# Altium footprint library ICS.PcbLib: 74 footprints (part 2 of 5)
Each footprint in its own frame and in the unit in brackets; x right, y up, seen from the top. Pads: shape width x height; smd on the part's side, far side on the other; paste and mask are expansions set on the pad; w line width, h text height; cw(c..) or ccw(c..) is an arc to the next point about the centre after c.
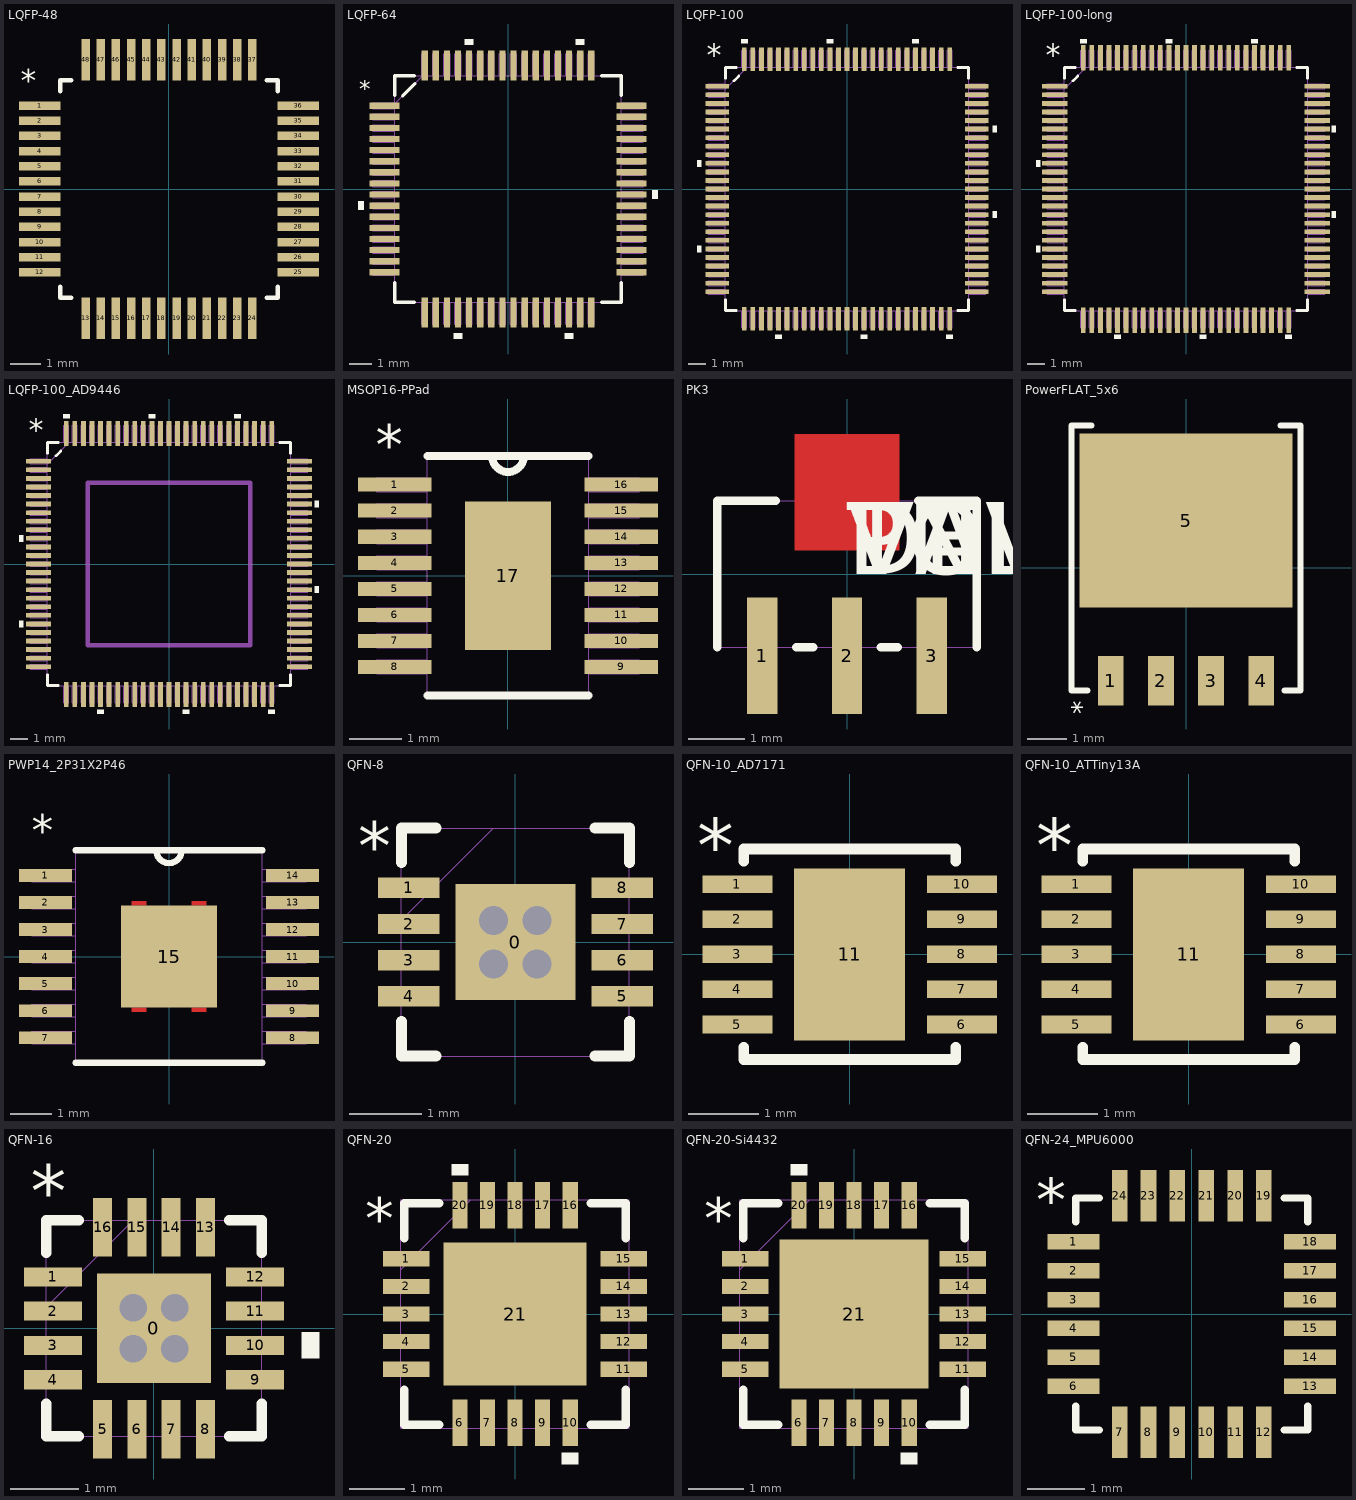
[diagram p1: the footprints below, top view; thin cyan lines are the x and y axes]

## LQFP-48 [mil]
pads (48):
  rect 54x11 smd: 1(-167.87,108.27) 2(-167.87,88.58) 3(-167.87,68.9) 4(-167.87,49.21) 5(-167.87,29.53) 6(-167.87,9.84) 7(-167.87,-9.84) 8(-167.87,-29.53) 9(-167.87,-49.21) 10(-167.87,-68.9) 11(-167.87,-88.58) 12(-167.87,-108.27) 25(167.87,-108.27) 26(167.87,-88.58) 27(167.87,-68.9) 28(167.87,-49.21) 29(167.87,-29.53) 30(167.87,-9.84) 31(167.87,9.84) 32(167.87,29.53) 33(167.87,49.21) 34(167.87,68.9) 35(167.87,88.58) 36(167.87,108.27)
  rect 11x54 smd: 13(-108.27,-167.87) 14(-88.58,-167.87) 15(-68.9,-167.87) 16(-49.21,-167.87) 17(-29.53,-167.87) 18(-9.84,-167.87) 19(9.84,-167.87) 20(29.53,-167.87) 21(49.21,-167.87) 22(68.9,-167.87) 23(88.58,-167.87) 24(108.27,-167.87) 37(108.27,167.87) 38(88.58,167.87) 39(68.9,167.87) 40(49.21,167.87) 41(29.53,167.87) 42(9.84,167.87) 43(-9.84,167.87) 44(-29.53,167.87) 45(-49.21,167.87) 46(-68.9,167.87) 47(-88.58,167.87) 48(-108.27,167.87)
Top Overlay:
  lines w6: -141.5,-126.87 -141.5,-141.5 -126.87,-141.5 ; -141.5,126.87 -141.5,141.5 -126.87,141.5 ; 126.87,-141.5 141.5,-141.5 141.5,-126.87 ; 126.87,141.5 141.5,141.5 141.5,126.87
  text "*" at -192.91,125.98 h30
3D body: height 59.15, standoff 0.48, extent -177.47,-177.47 177.46,177.46

## LQFP-64 [mil]
pads (64):
  rect 53.5x11 smd: 1(-219.25,147.64) 2(-219.25,127.95) 3(-219.25,108.27) 4(-219.25,88.58) 5(-219.25,68.9) 6(-219.25,49.21) 7(-219.25,29.53) 8(-219.25,9.84) 9(-219.25,-9.84) 10(-219.25,-29.53) 11(-219.25,-49.21) 12(-219.25,-68.9) 13(-219.25,-88.58) 14(-219.25,-108.27) 15(-219.25,-127.95) 16(-219.25,-147.64) 33(219.25,-147.64) 34(219.25,-127.95) 35(219.25,-108.27) 36(219.25,-88.58) 37(219.25,-68.9) 38(219.25,-49.21) 39(219.25,-29.53) 40(219.25,-9.84) 41(219.25,9.84) 42(219.25,29.53) 43(219.25,49.21) 44(219.25,68.9) 45(219.25,88.58) 46(219.25,108.27) 47(219.25,127.95) 48(219.25,147.64)
  rect 11x53.5 smd: 17(-147.64,-219.25) 18(-127.95,-219.25) 19(-108.27,-219.25) 20(-88.58,-219.25) 21(-68.9,-219.25) 22(-49.21,-219.25) 23(-29.53,-219.25) 24(-9.84,-219.25) 25(9.84,-219.25) 26(29.53,-219.25) 27(49.21,-219.25) 28(68.9,-219.25) 29(88.58,-219.25) 30(108.27,-219.25) 31(127.95,-219.25) 32(147.64,-219.25) 49(147.64,219.25) 50(127.95,219.25) 51(108.27,219.25) 52(88.58,219.25) 53(68.9,219.25) 54(49.21,219.25) 55(29.53,219.25) 56(9.84,219.25) 57(-9.84,219.25) 58(-29.53,219.25) 59(-49.21,219.25) 60(-68.9,219.25) 61(-88.58,219.25) 62(-108.27,219.25) 63(-127.95,219.25) 64(-147.64,219.25)
Top Overlay:
  region: -256,-22.03 -266,-22.03 -266,-37.03 -256,-37.03
  region: -81.08,-256 -96.08,-256 -96.08,-266 -81.08,-266
  region: 115.77,-256 100.77,-256 100.77,-266 115.77,-266
  region: 256,-2.34 266,-2.34 266,-17.34 256,-17.34
  region: 135.45,256 120.45,256 120.45,266 135.45,266
  region: -61.4,256 -76.4,256 -76.4,266 -61.4,266
  lines w6: -201,-166.24 -201,-201 -166.24,-201 ; -201,166.24 -201,201 -166.24,201 ; -186.98,165.02 -165.02,186.98 ; 166.24,-201 201,-201 201,-166.24 ; 166.24,201 201,201 201,166.24
  text "*" at -263.78,161.42 h30
Mechanical 1:
  drawing of 261 lines, arcs and shapes, not listed
3D body: height 58.77, standoff 0.6, extent -236.22,-236.22 236.22,236.22

## LQFP-100 [mil]
pads (100):
  rect 54x11 smd: 1(-298,236.22) 2(-298,216.54) 3(-298,196.85) 4(-298,177.17) 5(-298,157.48) 6(-298,137.8) 7(-298,118.11) 8(-298,98.43) 9(-298,78.74) 10(-298,59.06) 11(-298,39.37) 12(-298,19.69) 13(-298,0) 14(-298,-19.68) 15(-298,-39.37) 16(-298,-59.06) 17(-298,-78.74) 18(-298,-98.43) 19(-298,-118.11) 20(-298,-137.8) 21(-298,-157.48) 22(-298,-177.17) 23(-298,-196.85) 24(-298,-216.54) 25(-298,-236.22) 51(298,-236.22) 52(298,-216.54) 53(298,-196.85) 54(298,-177.17) 55(298,-157.48) 56(298,-137.8) 57(298,-118.11) 58(298,-98.43) 59(298,-78.74) 60(298,-59.06) 61(298,-39.37) 62(298,-19.68) 63(298,0) 64(298,19.68) 65(298,39.37) 66(298,59.06) 67(298,78.74) 68(298,98.43) 69(298,118.11) 70(298,137.8) 71(298,157.48) 72(298,177.17) 73(298,196.85) 74(298,216.54) 75(298,236.22)
  rect 11x54 smd: 26(-236.22,-298) 27(-216.54,-298) 28(-196.85,-298) 29(-177.17,-298) 30(-157.48,-298) 31(-137.8,-298) 32(-118.11,-298) 33(-98.43,-298) 34(-78.74,-298) 35(-59.06,-298) 36(-39.37,-298) 37(-19.68,-298) 38(0,-298) 39(19.68,-298) 40(39.37,-298) 41(59.06,-298) 42(78.74,-298) 43(98.43,-298) 44(118.11,-298) 45(137.8,-298) 46(157.48,-298) 47(177.17,-298) 48(196.85,-298) 49(216.54,-298) 50(236.22,-298) 76(236.22,298) 77(216.54,298) 78(196.85,298) 79(177.17,298) 80(157.48,298) 81(137.8,298) 82(118.11,298) 83(98.43,298) 84(78.74,298) 85(59.06,298) 86(39.37,298) 87(19.68,298) 88(0,298) 89(-19.68,298) 90(-39.37,298) 91(-59.06,298) 92(-78.74,298) 93(-98.43,298) 94(-118.11,298) 95(-137.8,298) 96(-157.48,298) 97(-177.17,298) 98(-196.85,298) 99(-216.54,298) 100(-236.22,298)
Top Overlay:
  region: -335,66.56 -345,66.56 -345,51.56 -335,51.56
  region: -335,-130.3 -345,-130.3 -345,-145.3 -335,-145.3
  region: -149.98,-335 -164.98,-335 -164.98,-345 -149.98,-345
  region: 46.87,-335 31.87,-335 31.87,-345 46.87,-345
  region: 243.72,-335 228.72,-335 228.72,-345 243.72,-345
  region: 335,-51.56 345,-51.56 345,-66.56 335,-66.56
  region: 335,145.3 345,145.3 345,130.3 335,130.3
  region: 164.98,335 149.98,335 149.98,345 164.98,345
  region: -31.87,335 -46.87,335 -46.87,345 -31.87,345
  region: -228.72,335 -243.72,335 -243.72,345 -228.72,345
  lines w6: -279.5,-254.82 -279.5,-279.5 -254.82,-279.5 ; -279.5,254.82 -279.5,279.5 -254.82,279.5 ; -260.07,248.93 -248.93,260.07 ; 254.82,-279.5 279.5,-279.5 279.5,-254.82 ; 254.82,279.5 279.5,279.5 279.5,254.82
  text "*" at -322.83,283.46 h50
Mechanical 1:
  drawing of 405 lines, arcs and shapes, not listed
3D body: height 59.21, standoff 0.48, extent -314.96,-314.96 314.96,314.95

## LQFP-100-long [mil]
pads (100):
  rect 57.95x11 smd: 1(-301.94,236.22) 2(-301.94,216.54) 3(-301.94,196.85) 4(-301.94,177.17) 5(-301.94,157.48) 6(-301.94,137.8) 7(-301.94,118.11) 8(-301.94,98.43) 9(-301.94,78.74) 10(-301.94,59.06) 11(-301.94,39.37) 12(-301.94,19.69) 13(-301.94,0) 14(-301.94,-19.68) 15(-301.94,-39.37) 16(-301.94,-59.06) 17(-301.94,-78.74) 18(-301.94,-98.43) 19(-301.94,-118.11) 20(-301.94,-137.8) 21(-301.94,-157.48) 22(-301.94,-177.17) 23(-301.94,-196.85) 24(-301.94,-216.54) 25(-301.94,-236.22) 51(301.94,-236.22) 52(301.94,-216.54) 53(301.94,-196.85) 54(301.94,-177.17) 55(301.94,-157.48) 56(301.94,-137.8) 57(301.94,-118.11) 58(301.94,-98.43) 59(301.94,-78.74) 60(301.94,-59.06) 61(301.94,-39.37) 62(301.94,-19.68) 63(301.94,0) 64(301.94,19.68) 65(301.94,39.37) 66(301.94,59.06) 67(301.94,78.74) 68(301.94,98.43) 69(301.94,118.11) 70(301.94,137.8) 71(301.94,157.48) 72(301.94,177.17) 73(301.94,196.85) 74(301.94,216.54) 75(301.94,236.22)
  rect 11x57.95 smd: 26(-236.22,-301.94) 27(-216.54,-301.94) 28(-196.85,-301.94) 29(-177.17,-301.94) 30(-157.48,-301.94) 31(-137.8,-301.94) 32(-118.11,-301.94) 33(-98.43,-301.94) 34(-78.74,-301.94) 35(-59.06,-301.94) 36(-39.37,-301.94) 37(-19.68,-301.94) 38(0,-301.94) 39(19.68,-301.94) 40(39.37,-301.94) 41(59.06,-301.94) 42(78.74,-301.94) 43(98.43,-301.94) 44(118.11,-301.94) 45(137.8,-301.94) 46(157.48,-301.94) 47(177.17,-301.94) 48(196.85,-301.94) 49(216.54,-301.94) 50(236.22,-301.94) 76(236.22,301.94) 77(216.54,301.94) 78(196.85,301.94) 79(177.17,301.94) 80(157.48,301.94) 81(137.8,301.94) 82(118.11,301.94) 83(98.43,301.94) 84(78.74,301.94) 85(59.06,301.94) 86(39.37,301.94) 87(19.68,301.94) 88(0,301.94) 89(-19.68,301.94) 90(-39.37,301.94) 91(-59.06,301.94) 92(-78.74,301.94) 93(-98.43,301.94) 94(-118.11,301.94) 95(-137.8,301.94) 96(-157.48,301.94) 97(-177.17,301.94) 98(-196.85,301.94) 99(-216.54,301.94) 100(-236.22,301.94)
Top Overlay:
  region: -228.72,335 -243.72,335 -243.72,345 -228.72,345
  region: -31.87,335 -46.87,335 -46.87,345 -31.87,345
  region: 164.98,335 149.98,335 149.98,345 164.98,345
  region: 335,145.3 345,145.3 345,130.3 335,130.3
  region: 335,-51.56 345,-51.56 345,-66.56 335,-66.56
  region: 243.72,-335 228.72,-335 228.72,-345 243.72,-345
  region: 46.87,-335 31.87,-335 31.87,-345 46.87,-345
  region: -149.98,-335 -164.98,-335 -164.98,-345 -149.98,-345
  region: -335,-130.3 -345,-130.3 -345,-145.3 -335,-145.3
  region: -335,66.56 -345,66.56 -345,51.56 -335,51.56
  lines w6: -279.5,-254.82 -279.5,-279.5 -254.82,-279.5 ; -279.5,254.82 -279.5,279.5 -254.82,279.5 ; -260.07,248.93 -248.93,260.07 ; 254.82,-279.5 279.5,-279.5 279.5,-254.82 ; 254.82,279.5 279.5,279.5 279.5,254.82
  text "*" at -322.83,283.46 h50
Mechanical 1:
  drawing of 405 lines, arcs and shapes, not listed
3D body: height 59.21, standoff 0.48, extent -314.96,-314.96 314.96,314.95

## LQFP-100_AD9446 [mil]
pads (100):
  rect 57.95x11 smd: 1(-299.97,236.22) 2(-299.97,216.54) 3(-299.97,196.85) 4(-299.97,177.17) 5(-299.97,157.48) 6(-299.97,137.8) 7(-299.97,118.11) 8(-299.97,98.43) 9(-299.97,78.74) 10(-299.97,59.06) 11(-299.97,39.37) 12(-299.97,19.69) 13(-299.97,0) 14(-299.97,-19.68) 15(-299.97,-39.37) 16(-299.97,-59.06) 17(-299.97,-78.74) 18(-299.97,-98.43) 19(-299.97,-118.11) 20(-299.97,-137.8) 21(-299.97,-157.48) 22(-299.97,-177.17) 23(-299.97,-196.85) 24(-299.97,-216.54) 25(-299.97,-236.22) 51(299.97,-236.22) 52(299.97,-216.54) 53(299.97,-196.85) 54(299.97,-177.17) 55(299.97,-157.48) 56(299.97,-137.8) 57(299.97,-118.11) 58(299.97,-98.43) 59(299.97,-78.74) 60(299.97,-59.06) 61(299.97,-39.37) 62(299.97,-19.68) 63(299.97,0) 64(299.97,19.68) 65(299.97,39.37) 66(299.97,59.06) 67(299.97,78.74) 68(299.97,98.43) 69(299.97,118.11) 70(299.97,137.8) 71(299.97,157.48) 72(299.97,177.17) 73(299.97,196.85) 74(299.97,216.54) 75(299.97,236.22)
  rect 11x57.95 smd: 26(-236.22,-299.97) 27(-216.54,-299.97) 28(-196.85,-299.97) 29(-177.17,-299.97) 30(-157.48,-299.97) 31(-137.8,-299.97) 32(-118.11,-299.97) 33(-98.43,-299.97) 34(-78.74,-299.97) 35(-59.06,-299.97) 36(-39.37,-299.97) 37(-19.68,-299.97) 38(0,-299.97) 39(19.68,-299.97) 40(39.37,-299.97) 41(59.06,-299.97) 42(78.74,-299.97) 43(98.43,-299.97) 44(118.11,-299.97) 45(137.8,-299.97) 46(157.48,-299.97) 47(177.17,-299.97) 48(196.85,-299.97) 49(216.54,-299.97) 50(236.22,-299.97) 76(236.22,299.97) 77(216.54,299.97) 78(196.85,299.97) 79(177.17,299.97) 80(157.48,299.97) 81(137.8,299.97) 82(118.11,299.97) 83(98.43,299.97) 84(78.74,299.97) 85(59.06,299.97) 86(39.37,299.97) 87(19.68,299.97) 88(0,299.97) 89(-19.68,299.97) 90(-39.37,299.97) 91(-59.06,299.97) 92(-78.74,299.97) 93(-98.43,299.97) 94(-118.11,299.97) 95(-137.8,299.97) 96(-157.48,299.97) 97(-177.17,299.97) 98(-196.85,299.97) 99(-216.54,299.97) 100(-236.22,299.97)
Top Overlay:
  region: 335,145.3 345,145.3 345,130.3 335,130.3
  region: 335,-51.56 345,-51.56 345,-66.56 335,-66.56
  region: -228.72,335 -243.72,335 -243.72,345 -228.72,345
  region: -31.87,335 -46.87,335 -46.87,345 -31.87,345
  region: 164.98,335 149.98,335 149.98,345 164.98,345
  region: -335,-130.3 -345,-130.3 -345,-145.3 -335,-145.3
  region: -335,66.56 -345,66.56 -345,51.56 -335,51.56
  region: 243.72,-335 228.72,-335 228.72,-345 243.72,-345
  region: 46.87,-335 31.87,-335 31.87,-345 46.87,-345
  region: -149.98,-335 -164.98,-335 -164.98,-345 -149.98,-345
  lines w6: -279.5,-254.82 -279.5,-279.5 -254.82,-279.5 ; -279.5,254.82 -279.5,279.5 -254.82,279.5 ; -260.07,248.93 -248.93,260.07 ; 254.82,-279.5 279.5,-279.5 279.5,-254.82 ; 254.82,279.5 279.5,279.5 279.5,254.82
  text "*" at -322.83,283.46 h50
Mechanical 1:
  drawing of 405 lines, arcs and shapes, not listed
Mechanical 13:
  lines w10: -187.01,-187.01 187.01,-187.01 187.01,187.01 -187.01,187.01 -187.01,-187.01
3D body: height 59.21, standoff 0.48, extent -314.96,-314.96 314.96,314.95

## MSOP16-PPad [mm]
pads (17):
  rect 1.411x0.27 smd: 1(-2.175,1.75) 2(-2.175,1.25) 3(-2.175,0.75) 4(-2.175,0.25) 5(-2.175,-0.25) 6(-2.175,-0.75) 7(-2.175,-1.25) 8(-2.175,-1.75) 9(2.175,-1.75) 10(2.175,-1.25) 11(2.175,-0.75) 12(2.175,-0.25) 13(2.175,0.25) 14(2.175,0.75) 15(2.175,1.25) 16(2.175,1.75)
  rect 1.65x2.85 smd: 17(0,0)
Top Overlay:
  lines w0.152: -1.55,-2.3 1.55,-2.3 ; -1.55,2.3 1.55,2.3 ; -0.305,2.3 ccw(c0,2.3) 0.305,2.3
  text "*" at -2.54,2.147 h0.76
Mechanical 1:
  lines w0: -0.305,2.3 ccw(c0,2.3) 0.305,2.3 ; -2.525,-1.885 -1.55,-1.885 -1.55,-1.615 -2.525,-1.615 -2.525,-1.885 ; -2.525,-1.385 -1.55,-1.385 -1.55,-1.115 -2.525,-1.115 -2.525,-1.385 ; -2.525,-0.885 -1.55,-0.885 -1.55,-0.615 -2.525,-0.615 -2.525,-0.885 ; -2.525,-0.385 -2.525,-0.115 -1.55,-0.115 -1.55,-0.385 -2.525,-0.385 ; -2.525,0.115 -2.525,0.385 -1.55,0.385 -1.55,0.115 -2.525,0.115 ; -2.525,0.615 -2.525,0.885 -1.55,0.885 -1.55,0.615 -2.525,0.615 ; -2.525,1.115 -2.525,1.385 -1.55,1.385 -1.55,1.115 -2.525,1.115 ; -2.525,1.615 -2.525,1.885 -1.55,1.885 -1.55,1.615 -2.525,1.615 ; -1.55,-2.3 1.55,-2.3 1.55,2.3 -1.55,2.3 -1.55,-2.3 ; 1.55,-1.885 2.525,-1.885 2.525,-1.615 1.55,-1.615 1.55,-1.885 ; 1.55,-1.385 2.525,-1.385 2.525,-1.115 1.55,-1.115 1.55,-1.385 ; 1.55,-0.885 2.525,-0.885 2.525,-0.615 1.55,-0.615 1.55,-0.885 ; 1.55,-0.385 1.55,-0.115 2.525,-0.115 2.525,-0.385 1.55,-0.385 ; 1.55,0.115 1.55,0.385 2.525,0.385 2.525,0.115 1.55,0.115 ; 1.55,0.615 1.55,0.885 2.525,0.885 2.525,0.615 1.55,0.615 ; 1.55,1.115 1.55,1.385 2.525,1.385 2.525,1.115 1.55,1.115 ; 1.55,1.615 1.55,1.885 2.525,1.885 2.525,1.615 1.55,1.615
3D body: height 0.97, standoff 0.02, extent -2.45,-2.019 2.45,2.019

## PK3 [mil]
pads (3):
  rect 21x81 smd: 1(-59.06,-57) 2(0,-57) 3(59.06,-57)
Top Layer:
  region: 36.5,16.5 36.5,97.5 -36.5,97.5 -36.5,16.5
Top Overlay:
  lines w6: -90.5,-51 -90.5,51 -49.6,51 ; -35.46,-51 -23.6,-51 ; 23.6,-51 35.46,-51 ; 49.6,51 90.5,51 90.5,-51
  text "PN" at 0,0 h50
  text "DEV" at 0,0 h50
  text "VAL" at 0,0 h50
  text "TOL" at 0,0 h50
Top Paste:
  region: 36.5,16.5 36.5,97.5 -36.5,97.5 -36.5,16.5
Top Solder:
  region: 37.5,2.5 37.5,111.5 -37.5,111.5 -37.5,2.5
Mechanical 1:
  lines w0: -90.5,-51 90.5,-51 90.5,51 -90.5,51 -90.5,-51 ; -68.56,-83.5 -68.56,-51 -49.56,-51 -49.56,-83.5 -68.56,-83.5 ; -35.5,51 35.5,51 35.5,83.5 -35.5,83.5 -35.5,51 ; -9.5,-83.5 -9.5,-51 9.5,-51 9.5,-83.5 -9.5,-83.5 ; 49.56,-83.5 49.56,-51 68.56,-51 68.56,-83.5 49.56,-83.5
  text "RefDes2" at 0,0 h50

## PowerFLAT_5x6 [mm] "PowerFLAT 5x6"
pads (5):
  rect 0.65x1.25 smd: 1(-1.905,-2.86) 2(-0.635,-2.86) 3(0.635,-2.86) 4(1.905,-2.86)
  rect 5.4x4.4 smd: 5(0,1.2)
Top Overlay:
  lines w0.152: -2.9,-3.11 -2.5,-3.11 ; -2.9,-3.1 -2.9,3.6 ; -2.9,3.61 -2.4,3.61 ; 2.4,3.61 2.9,3.61 ; 2.5,-3.11 2.9,-3.11 ; 2.9,-3.1 2.9,3.6
  text "*" at -2.4,-3.7 h0.5
3D body: height 1.02, standoff 0.01, extent -2.6,-3.075 2.6,3.075

## PWP14_2P31X2P46 [mil]
pads (15):
  rect 50x12 smd: 1(-117,76.77) 2(-117,51.18) 3(-117,25.59) 4(-117,0) 5(-117,-25.59) 6(-117,-51.18) 7(-117,-76.77) 8(117,-76.77) 9(117,-51.18) 10(117,-25.59) 11(117,0) 12(117,25.59) 13(117,51.18) 14(117,76.77)
  rect 90.94x96.85 smd: 15(0,0)
Top Layer:
  region: 35.43,-48.43 21.65,-48.43 21.65,-52.36 35.43,-52.36
  region: -35.43,-48.43 -21.65,-48.43 -21.65,-52.36 -35.43,-52.36
  region: -35.43,48.43 -21.65,48.43 -21.65,52.36 -35.43,52.36
  region: 35.43,48.43 21.65,48.43 21.65,52.36 35.43,52.36
  region: 0,-48.43
  region: 0,48.43
Top Overlay:
  lines w6: -88.5,-100.5 88.5,-100.5 ; -88.5,100.5 88.5,100.5 ; -12,100.5 ccw(c0,100.5) 12,100.5
  text "*" at -130,105 h30
Top Solder:
  region: 35.43,-48.43 21.65,-48.43 21.65,-52.36 35.43,-52.36
  region: -35.43,-48.43 -21.65,-48.43 -21.65,-52.36 -35.43,-52.36
  region: -35.43,48.43 -21.65,48.43 -21.65,52.36 -35.43,52.36
  region: 35.43,48.43 21.65,48.43 21.65,52.36 35.43,52.36
  region: 0,-48.43
  region: 0,48.43
Mechanical 1:
  lines w0: -12,100.5 ccw(c0,100.5) 12,100.5 ; -130,-82.77 -88.5,-82.77 -88.5,-70.77 -130,-70.77 -130,-82.77 ; -130,-57.18 -88.5,-57.18 -88.5,-45.18 -130,-45.18 -130,-57.18 ; -130,-31.59 -88.5,-31.59 -88.5,-19.59 -130,-19.59 -130,-31.59 ; -130,-6 -88.5,-6 -88.5,6 -130,6 -130,-6 ; -130,19.59 -88.5,19.59 -88.5,31.59 -130,31.59 -130,19.59 ; -130,45.18 -88.5,45.18 -88.5,57.18 -130,57.18 -130,45.18 ; -130,70.77 -88.5,70.77 -88.5,82.77 -130,82.77 -130,70.77 ; -88.5,-100.5 -88.5,100.5 88.5,100.5 88.5,-100.5 -88.5,-100.5 ; 88.5,-82.77 130,-82.77 130,-70.77 88.5,-70.77 88.5,-82.77 ; 88.5,-57.18 130,-57.18 130,-45.18 88.5,-45.18 88.5,-57.18 ; 88.5,-31.59 130,-31.59 130,-19.59 88.5,-19.59 88.5,-31.59 ; 88.5,-6 130,-6 130,6 88.5,6 88.5,-6 ; 88.5,19.59 130,19.59 130,31.59 88.5,31.59 88.5,19.59 ; 88.5,45.18 130,45.18 130,57.18 88.5,57.18 88.5,45.18 ; 88.5,70.77 130,70.77 130,82.77 88.5,82.77 88.5,70.77
3D body: height 39.58, standoff 0.6, extent -126.33,-98.42 126.33,98.43

## QFN-8 [mm]
pads (9):
  rect 1.66x1.6 smd paste-0.817 mask-0.813: 0(0,0)
  rect 0.85x0.28 smd paste-0.14: 1(-1.475,0.75) 2(-1.475,0.25) 3(-1.475,-0.25) 4(-1.475,-0.75) 5(1.475,-0.75) 6(1.475,-0.25) 7(1.475,0.25) 8(1.475,0.75)
via 0.3,-0.3 diameter 0.7 hole 0.4
via 0.3,0.3 diameter 0.7 hole 0.4
via -0.3,-0.3 diameter 0.7 hole 0.4
via -0.3,0.3 diameter 0.7 hole 0.4
Top Overlay:
  lines w0.152: -1.575,-1.1 -1.575,-1.575 -1.1,-1.575 ; -1.575,1.1 -1.575,1.575 -1.1,1.575 ; 1.1,-1.575 1.575,-1.575 1.575,-1.1 ; 1.1,1.575 1.575,1.575 1.575,1.1
  text "*" at -2.175,1 h0.66
Top Paste:
  region: -1.075,0.865 -1.875,0.865 -1.875,0.635 -1.075,0.635
  region: -1.075,0.365 -1.875,0.365 -1.875,0.135 -1.075,0.135
  region: -1.075,-0.135 -1.875,-0.135 -1.875,-0.365 -1.075,-0.365
  region: -1.075,-0.635 -1.875,-0.635 -1.875,-0.865 -1.075,-0.865
  region: -0.494,0.725 -0.755,0.725 -0.755,0.494 -0.635,0.494 -0.494,0.635
  region: -0.635,0.294 -0.755,0.294 -0.755,-0.294 -0.635,-0.294 -0.494,-0.152 -0.494,0.152
  region: -0.635,-0.494 -0.755,-0.494 -0.755,-0.725 -0.494,-0.725 -0.494,-0.635
  region: 0.294,0.725 -0.294,0.725 -0.294,0.635 -0.152,0.494 0.152,0.494 0.294,0.635
  region: 0.152,0.294 -0.152,0.294 -0.294,0.152 -0.294,-0.152 -0.152,-0.294 0.152,-0.294 0.294,-0.152 0.294,0.152
  region: 0.152,-0.494 -0.152,-0.494 -0.294,-0.635 -0.294,-0.725 0.294,-0.725 0.294,-0.635
  region: 0.755,0.725 0.494,0.725 0.494,0.635 0.635,0.494 0.755,0.494
  region: 0.755,0.294 0.635,0.294 0.494,0.152 0.494,-0.152 0.635,-0.294 0.755,-0.294
  region: 0.755,-0.494 0.635,-0.494 0.494,-0.635 0.494,-0.725 0.755,-0.725
  region: 1.875,0.865 1.075,0.865 1.075,0.635 1.875,0.635
  region: 1.875,0.365 1.075,0.365 1.075,0.135 1.875,0.135
  region: 1.875,-0.135 1.075,-0.135 1.075,-0.365 1.875,-0.365
  region: 1.875,-0.635 1.075,-0.635 1.075,-0.865 1.875,-0.865
Top Solder:
  region: -0.98,0.96 -1.97,0.96 -1.97,0.54 -0.98,0.54
  region: -0.98,0.46 -1.97,0.46 -1.97,0.04 -0.98,0.04
  region: -0.98,-0.04 -1.97,-0.04 -1.97,-0.46 -0.98,-0.46
  region: -0.98,-0.54 -1.97,-0.54 -1.97,-0.96 -0.98,-0.96
  region: 1.97,0.46 0.98,0.46 0.98,0.04 1.97,0.04
  region: 1.97,0.96 0.98,0.96 0.98,0.54 1.97,0.54
  region: -0.894,0.594 -0.894,0.864 0.894,0.864 0.894,0.594
  region: -0.894,-0.194 -0.894,0.194 0.894,0.194 0.894,-0.194
  region: -0.894,-0.864 -0.894,-0.594 0.894,-0.594 0.894,-0.864
  region: -0.894,-0.864 -0.894,0.864 -0.594,0.864 -0.594,-0.864
  region: 0.194,-0.864 0.194,0.864 -0.194,0.864 -0.194,-0.864
  region: 0.594,-0.864 0.594,0.864 0.894,0.864 0.894,-0.864
  region: 1.97,-0.54 0.98,-0.54 0.98,-0.96 1.97,-0.96
  region: 1.97,-0.04 0.98,-0.04 0.98,-0.46 1.97,-0.46
Mechanical 1:
  lines w0: -1.575,0.305 -0.305,1.575 ; -1.575,-1.575 1.575,-1.575 1.575,1.575 -1.575,1.575 -1.575,-1.575 ; -1.575,-0.902 -1.575,-0.598 -1.575,-0.902 ; -1.575,-0.402 -1.575,-0.098 -1.575,-0.402 ; -1.575,0.098 -1.575,0.402 -1.575,0.098 ; -1.575,0.598 -1.575,0.902 -1.575,0.598 ; 1.575,-0.902 1.575,-0.598 1.575,-0.902 ; 1.575,-0.402 1.575,-0.098 1.575,-0.402 ; 1.575,0.098 1.575,0.402 1.575,0.098 ; 1.575,0.598 1.575,0.902 1.575,0.598

## QFN-10_AD7171 [mm]
pads (11):
  rect 1x0.25 smd: 1(-1.6,1) 2(-1.6,0.5) 3(-1.6,0) 4(-1.6,-0.5) 5(-1.6,-1) 6(1.6,-1) 7(1.6,-0.5) 8(1.6,0) 9(1.6,0.5) 10(1.6,1)
  rect 1.58x2.45 smd: 11(0,0)
Top Overlay:
  lines w0.152: -1.51,-1.325 -1.51,-1.5 0.459,-1.5 1.51,-1.5 1.51,-1.325 ; -1.51,1.325 -1.51,1.5 0.459,1.5 1.51,1.5 1.51,1.325
  text "*" at -2.175,1.175 h0.76
3D body: height 0.79, standoff 0.02, extent -1.51,-1.5 1.51,1.5

## QFN-10_ATTiny13A [mm]
pads (11):
  rect 1x0.25 smd: 1(-1.6,1) 2(-1.6,0.5) 3(-1.6,0) 4(-1.6,-0.5) 5(-1.6,-1) 6(1.6,-1) 7(1.6,-0.5) 8(1.6,0) 9(1.6,0.5) 10(1.6,1)
  rect 1.58x2.45 smd: 11(0,0)
Top Overlay:
  lines w0.152: -1.51,-1.325 -1.51,-1.5 0.459,-1.5 1.51,-1.5 1.51,-1.325 ; -1.51,1.325 -1.51,1.5 0.459,1.5 1.51,1.5 1.51,1.325
  text "*" at -2.175,1.175 h0.76
3D body: height 0.94, standoff 0.02, extent -1.51,-1.5 1.51,1.5

## QFN-16 [mm]
pads (17):
  rect 1.66x1.6 smd paste-0.817 mask-0.813: 0(0,0)
  rect 0.85x0.28 smd paste-0.14: 1(-1.475,0.75) 2(-1.475,0.25) 3(-1.475,-0.25) 4(-1.475,-0.75) 9(1.475,-0.75) 10(1.475,-0.25) 11(1.475,0.25) 12(1.475,0.75)
  rect 0.28x0.85 smd paste-0.14: 5(-0.75,-1.475) 6(-0.25,-1.475) 7(0.25,-1.475) 8(0.75,-1.475) 13(0.75,1.475) 14(0.25,1.475) 15(-0.25,1.475) 16(-0.75,1.475)
via 0.3,-0.3 diameter 0.7 hole 0.4
via 0.3,0.3 diameter 0.7 hole 0.4
via -0.3,-0.3 diameter 0.7 hole 0.4
via -0.3,0.3 diameter 0.7 hole 0.4
Top Overlay:
  region: 2.154,-0.059 2.408,-0.059 2.408,-0.44 2.154,-0.44
  lines w0.152: -1.575,-1.1 -1.575,-1.575 -1.1,-1.575 ; -1.575,1.1 -1.575,1.575 -1.1,1.575 ; 1.1,-1.575 1.575,-1.575 1.575,-1.1 ; 1.1,1.575 1.575,1.575 1.575,1.1
  text "*" at -1.8,1.625 h0.76
Top Paste:
  region: -1.075,0.865 -1.875,0.865 -1.875,0.635 -1.075,0.635
  region: -1.075,0.365 -1.875,0.365 -1.875,0.135 -1.075,0.135
  region: -1.075,-0.135 -1.875,-0.135 -1.875,-0.365 -1.075,-0.365
  region: -1.075,-0.635 -1.875,-0.635 -1.875,-0.865 -1.075,-0.865
  region: -0.635,-1.075 -0.865,-1.075 -0.865,-1.875 -0.635,-1.875
  region: -0.135,-1.075 -0.365,-1.075 -0.365,-1.875 -0.135,-1.875
  region: 0.365,-1.075 0.135,-1.075 0.135,-1.875 0.365,-1.875
  region: 0.865,-1.075 0.635,-1.075 0.635,-1.875 0.865,-1.875
  region: 1.875,-0.635 1.075,-0.635 1.075,-0.865 1.875,-0.865
  region: 1.875,-0.135 1.075,-0.135 1.075,-0.365 1.875,-0.365
  region: 1.875,0.365 1.075,0.365 1.075,0.135 1.875,0.135
  region: 1.875,0.865 1.075,0.865 1.075,0.635 1.875,0.635
  region: 0.865,1.875 0.635,1.875 0.635,1.075 0.865,1.075
  region: 0.365,1.875 0.135,1.875 0.135,1.075 0.365,1.075
  region: -0.135,1.875 -0.365,1.875 -0.365,1.075 -0.135,1.075
  region: -0.635,1.875 -0.865,1.875 -0.865,1.075 -0.635,1.075
  region: -0.494,0.725 -0.755,0.725 -0.755,0.494 -0.635,0.494 -0.494,0.635
  region: -0.635,0.294 -0.755,0.294 -0.755,-0.294 -0.635,-0.294 -0.494,-0.152 -0.494,0.152
  region: -0.635,-0.494 -0.755,-0.494 -0.755,-0.725 -0.494,-0.725 -0.494,-0.635
  region: 0.294,0.725 -0.294,0.725 -0.294,0.635 -0.152,0.494 0.152,0.494 0.294,0.635
  region: 0.152,0.294 -0.152,0.294 -0.294,0.152 -0.294,-0.152 -0.152,-0.294 0.152,-0.294 0.294,-0.152 0.294,0.152
  region: 0.152,-0.494 -0.152,-0.494 -0.294,-0.635 -0.294,-0.725 0.294,-0.725 0.294,-0.635
  region: 0.755,0.725 0.494,0.725 0.494,0.635 0.635,0.494 0.755,0.494
  region: 0.755,0.294 0.635,0.294 0.494,0.152 0.494,-0.152 0.635,-0.294 0.755,-0.294
  region: 0.755,-0.494 0.635,-0.494 0.494,-0.635 0.494,-0.725 0.755,-0.725
Top Solder:
  region: -0.98,0.96 -1.97,0.96 -1.97,0.54 -0.98,0.54
  region: -0.98,0.46 -1.97,0.46 -1.97,0.04 -0.98,0.04
  region: -0.98,-0.04 -1.97,-0.04 -1.97,-0.46 -0.98,-0.46
  region: -0.98,-0.54 -1.97,-0.54 -1.97,-0.96 -0.98,-0.96
  region: -0.54,-0.98 -0.96,-0.98 -0.96,-1.97 -0.54,-1.97
  region: -0.04,-0.98 -0.46,-0.98 -0.46,-1.97 -0.04,-1.97
  region: 0.46,-0.98 0.04,-0.98 0.04,-1.97 0.46,-1.97
  region: 0.96,-0.98 0.54,-0.98 0.54,-1.97 0.96,-1.97
  region: 1.97,-0.54 0.98,-0.54 0.98,-0.96 1.97,-0.96
  region: 1.97,-0.04 0.98,-0.04 0.98,-0.46 1.97,-0.46
  region: 1.97,0.46 0.98,0.46 0.98,0.04 1.97,0.04
  region: 1.97,0.96 0.98,0.96 0.98,0.54 1.97,0.54
  region: 0.96,1.97 0.54,1.97 0.54,0.98 0.96,0.98
  region: 0.46,1.97 0.04,1.97 0.04,0.98 0.46,0.98
  region: -0.04,1.97 -0.46,1.97 -0.46,0.98 -0.04,0.98
  region: -0.54,1.97 -0.96,1.97 -0.96,0.98 -0.54,0.98
  region: -0.894,0.594 -0.894,0.864 0.894,0.864 0.894,0.594
  region: -0.894,-0.194 -0.894,0.194 0.894,0.194 0.894,-0.194
  region: -0.894,-0.864 -0.894,-0.594 0.894,-0.594 0.894,-0.864
  region: -0.894,-0.864 -0.894,0.864 -0.594,0.864 -0.594,-0.864
  region: 0.194,-0.864 0.194,0.864 -0.194,0.864 -0.194,-0.864
  region: 0.594,-0.864 0.594,0.864 0.894,0.864 0.894,-0.864
Mechanical 1:
  lines w0: -1.575,0.305 -0.305,1.575 ; -1.575,-1.575 1.575,-1.575 1.575,1.575 -1.575,1.575 -1.575,-1.575 ; -1.575,-0.902 -1.575,-0.598 -1.575,-0.902 ; -1.575,-0.402 -1.575,-0.098 -1.575,-0.402 ; -1.575,0.098 -1.575,0.402 -1.575,0.098 ; -1.575,0.598 -1.575,0.902 -1.575,0.598 ; -0.902,-1.575 -0.598,-1.575 -0.902,-1.575 ; -0.902,1.575 -0.598,1.575 -0.902,1.575 ; -0.402,-1.575 -0.098,-1.575 -0.402,-1.575 ; -0.402,1.575 -0.098,1.575 -0.402,1.575 ; 0.098,-1.575 0.402,-1.575 0.098,-1.575 ; 0.098,1.575 0.402,1.575 0.098,1.575 ; 0.598,-1.575 0.902,-1.575 0.598,-1.575 ; 0.598,1.575 0.902,1.575 0.598,1.575 ; 1.575,-0.902 1.575,-0.598 1.575,-0.902 ; 1.575,-0.402 1.575,-0.098 1.575,-0.402 ; 1.575,0.098 1.575,0.402 1.575,0.098 ; 1.575,0.598 1.575,0.902 1.575,0.598

## QFN-20 [mm]
pads (21):
  rect 0.85x0.28 smd paste-0.14: 1(-1.975,1) 2(-1.975,0.5) 3(-1.975,0) 4(-1.975,-0.5) 5(-1.975,-1) 11(1.975,-1) 12(1.975,-0.5) 13(1.975,0) 14(1.975,0.5) 15(1.975,1)
  rect 0.28x0.85 smd paste-0.14: 6(-1,-1.975) 7(-0.5,-1.975) 8(0,-1.975) 9(0.5,-1.975) 10(1,-1.975) 16(1,1.975) 17(0.5,1.975) 18(0,1.975) 19(-0.5,1.975) 20(-1,1.975)
  rect 2.6x2.6 smd paste-1.337 mask-1.333: 21(0,0)
Top Overlay:
  region: 1.15,-2.725 0.85,-2.725 0.85,-2.525 1.15,-2.525
  region: -0.85,2.525 -1.15,2.525 -1.15,2.725 -0.85,2.725
  lines w0.152: -2.01,-1.375 -2.01,-2.01 -1.375,-2.01 ; -2.01,1.375 -2.01,2.01 -1.375,2.01 ; 1.375,-2.01 2.01,-2.01 2.01,-1.375 ; 1.375,2.01 2.01,2.01 2.01,1.375
  text "*" at -2.725,1.35 h0.76
Top Paste:
  drawing of 36 lines, arcs and shapes, not listed
Top Solder:
  region: -1.48,1.21 -2.47,1.21 -2.47,0.79 -1.48,0.79
  region: -1.48,0.71 -2.47,0.71 -2.47,0.29 -1.48,0.29
  region: -1.48,0.21 -2.47,0.21 -2.47,-0.21 -1.48,-0.21
  region: -1.48,-0.29 -2.47,-0.29 -2.47,-0.71 -1.48,-0.71
  region: -1.48,-0.79 -2.47,-0.79 -2.47,-1.21 -1.48,-1.21
  region: -0.79,-1.48 -1.21,-1.48 -1.21,-2.47 -0.79,-2.47
  region: -0.29,-1.48 -0.71,-1.48 -0.71,-2.47 -0.29,-2.47
  region: 0.21,-1.48 -0.21,-1.48 -0.21,-2.47 0.21,-2.47
  region: 0.71,-1.48 0.29,-1.48 0.29,-2.47 0.71,-2.47
  region: 1.21,-1.48 0.79,-1.48 0.79,-2.47 1.21,-2.47
  region: 2.47,-0.79 1.48,-0.79 1.48,-1.21 2.47,-1.21
  region: 2.47,-0.29 1.48,-0.29 1.48,-0.71 2.47,-0.71
  region: 2.47,0.21 1.48,0.21 1.48,-0.21 2.47,-0.21
  region: 2.47,0.71 1.48,0.71 1.48,0.29 2.47,0.29
  region: 2.47,1.21 1.48,1.21 1.48,0.79 2.47,0.79
  region: 1.21,2.47 0.79,2.47 0.79,1.48 1.21,1.48
  region: 0.71,2.47 0.29,2.47 0.29,1.48 0.71,1.48
  region: 0.21,2.47 -0.21,2.47 -0.21,1.48 0.21,1.48
  region: -0.29,2.47 -0.71,2.47 -0.71,1.48 -0.29,1.48
  region: -0.79,2.47 -1.21,2.47 -1.21,1.48 -0.79,1.48
  region: -1.413,0.987 -1.413,1.413 1.413,1.413 1.413,0.987
  region: -1.413,0.2 -1.413,0.587 1.413,0.587 1.413,0.2
  region: -1.413,-0.587 -1.413,-0.2 1.413,-0.2 1.413,-0.587
  region: -1.413,-1.413 -1.413,-0.987 1.413,-0.987 1.413,-1.413
  region: -1.413,-1.413 -1.413,1.413 -0.987,1.413 -0.987,-1.413
  region: -0.2,-1.413 -0.2,1.413 -0.587,1.413 -0.587,-1.413
  region: 0.587,-1.413 0.587,1.413 0.2,1.413 0.2,-1.413
  region: 0.987,-1.413 0.987,1.413 1.413,1.413 1.413,-1.413
Mechanical 1:
  lines w0: -2.075,0.805 -0.805,2.075 ; -2.075,-2.075 2.075,-2.075 2.075,2.075 -2.075,2.075 -2.075,-2.075 ; -2.075,-1.15 -2.075,-0.85 -2.075,-1.15 ; -2.075,-0.65 -2.075,-0.35 -2.075,-0.65 ; -2.075,-0.15 -2.075,0.15 -2.075,-0.15 ; -2.075,0.35 -2.075,0.65 -2.075,0.35 ; -2.075,0.85 -2.075,1.15 -2.075,0.85 ; -1.15,-2.075 -0.85,-2.075 -1.15,-2.075 ; -1.15,2.075 -0.85,2.075 -1.15,2.075 ; -0.65,-2.075 -0.35,-2.075 -0.65,-2.075 ; -0.65,2.075 -0.35,2.075 -0.65,2.075 ; -0.15,-2.075 0.15,-2.075 -0.15,-2.075 ; -0.15,2.075 0.15,2.075 -0.15,2.075 ; 0.35,-2.075 0.65,-2.075 0.35,-2.075 ; 0.35,2.075 0.65,2.075 0.35,2.075 ; 0.85,-2.075 1.15,-2.075 0.85,-2.075 ; 0.85,2.075 1.15,2.075 0.85,2.075 ; 2.075,-1.15 2.075,-0.85 2.075,-1.15 ; 2.075,-0.65 2.075,-0.35 2.075,-0.65 ; 2.075,-0.15 2.075,0.15 2.075,-0.15 ; 2.075,0.35 2.075,0.65 2.075,0.35 ; 2.075,0.85 2.075,1.15 2.075,0.85
3D body: height 0.94, standoff 0.02, extent -2.01,-2.01 2.01,2.01

## QFN-20-Si4432 [mm]
pads (21):
  rect 0.85x0.28 smd paste-0.14: 1(-1.975,1) 2(-1.975,0.5) 3(-1.975,0) 4(-1.975,-0.5) 5(-1.975,-1) 11(1.975,-1) 12(1.975,-0.5) 13(1.975,0) 14(1.975,0.5) 15(1.975,1)
  rect 0.28x0.85 smd paste-0.14: 6(-1,-1.975) 7(-0.5,-1.975) 8(0,-1.975) 9(0.5,-1.975) 10(1,-1.975) 16(1,1.975) 17(0.5,1.975) 18(0,1.975) 19(-0.5,1.975) 20(-1,1.975)
  rect 2.7x2.7 smd paste-1.337 mask-1.333: 21(0,0)
Top Overlay:
  region: -0.85,2.525 -1.15,2.525 -1.15,2.725 -0.85,2.725
  region: 1.15,-2.725 0.85,-2.725 0.85,-2.525 1.15,-2.525
  lines w0.152: -2.01,-1.375 -2.01,-2.01 -1.375,-2.01 ; -2.01,1.375 -2.01,2.01 -1.375,2.01 ; 1.375,-2.01 2.01,-2.01 2.01,-1.375 ; 1.375,2.01 2.01,2.01 2.01,1.375
  text "*" at -2.725,1.35 h0.76
Top Paste:
  drawing of 36 lines, arcs and shapes, not listed
Top Solder:
  region: 0.987,-1.413 0.987,1.413 1.413,1.413 1.413,-1.413
  region: 0.587,-1.413 0.587,1.413 0.2,1.413 0.2,-1.413
  region: -0.2,-1.413 -0.2,1.413 -0.587,1.413 -0.587,-1.413
  region: -1.413,-1.413 -1.413,1.413 -0.987,1.413 -0.987,-1.413
  region: -1.413,-1.413 -1.413,-0.987 1.413,-0.987 1.413,-1.413
  region: -1.413,-0.587 -1.413,-0.2 1.413,-0.2 1.413,-0.587
  region: -1.413,0.2 -1.413,0.587 1.413,0.587 1.413,0.2
  region: -1.413,0.987 -1.413,1.413 1.413,1.413 1.413,0.987
  region: -0.79,2.47 -1.21,2.47 -1.21,1.48 -0.79,1.48
  region: -0.29,2.47 -0.71,2.47 -0.71,1.48 -0.29,1.48
  region: 0.21,2.47 -0.21,2.47 -0.21,1.48 0.21,1.48
  region: 0.71,2.47 0.29,2.47 0.29,1.48 0.71,1.48
  region: 1.21,2.47 0.79,2.47 0.79,1.48 1.21,1.48
  region: 2.47,1.21 1.48,1.21 1.48,0.79 2.47,0.79
  region: 2.47,0.71 1.48,0.71 1.48,0.29 2.47,0.29
  region: 2.47,0.21 1.48,0.21 1.48,-0.21 2.47,-0.21
  region: 2.47,-0.29 1.48,-0.29 1.48,-0.71 2.47,-0.71
  region: 2.47,-0.79 1.48,-0.79 1.48,-1.21 2.47,-1.21
  region: 1.21,-1.48 0.79,-1.48 0.79,-2.47 1.21,-2.47
  region: 0.71,-1.48 0.29,-1.48 0.29,-2.47 0.71,-2.47
  region: 0.21,-1.48 -0.21,-1.48 -0.21,-2.47 0.21,-2.47
  region: -0.29,-1.48 -0.71,-1.48 -0.71,-2.47 -0.29,-2.47
  region: -0.79,-1.48 -1.21,-1.48 -1.21,-2.47 -0.79,-2.47
  region: -1.48,-0.79 -2.47,-0.79 -2.47,-1.21 -1.48,-1.21
  region: -1.48,-0.29 -2.47,-0.29 -2.47,-0.71 -1.48,-0.71
  region: -1.48,0.21 -2.47,0.21 -2.47,-0.21 -1.48,-0.21
  region: -1.48,0.71 -2.47,0.71 -2.47,0.29 -1.48,0.29
  region: -1.48,1.21 -2.47,1.21 -2.47,0.79 -1.48,0.79
Mechanical 1:
  lines w0: -2.075,0.805 -0.805,2.075 ; -2.075,-2.075 -2.075,2.075 2.075,2.075 2.075,-2.075 -2.075,-2.075 ; -2.075,-1.15 -2.075,-0.85 -2.075,-1.15 ; -2.075,-0.65 -2.075,-0.35 -2.075,-0.65 ; -2.075,-0.15 -2.075,0.15 -2.075,-0.15 ; -2.075,0.35 -2.075,0.65 -2.075,0.35 ; -2.075,0.85 -2.075,1.15 -2.075,0.85 ; -1.15,-2.075 -0.85,-2.075 -1.15,-2.075 ; -1.15,2.075 -0.85,2.075 -1.15,2.075 ; -0.65,-2.075 -0.35,-2.075 -0.65,-2.075 ; -0.65,2.075 -0.35,2.075 -0.65,2.075 ; -0.15,-2.075 0.15,-2.075 -0.15,-2.075 ; -0.15,2.075 0.15,2.075 -0.15,2.075 ; 0.35,-2.075 0.65,-2.075 0.35,-2.075 ; 0.35,2.075 0.65,2.075 0.35,2.075 ; 0.85,-2.075 1.15,-2.075 0.85,-2.075 ; 0.85,2.075 1.15,2.075 0.85,2.075 ; 2.075,-1.15 2.075,-0.85 2.075,-1.15 ; 2.075,-0.65 2.075,-0.35 2.075,-0.65 ; 2.075,-0.15 2.075,0.15 2.075,-0.15 ; 2.075,0.35 2.075,0.65 2.075,0.35 ; 2.075,0.85 2.075,1.15 2.075,0.85
3D body: height 0.94, standoff 0.02, extent -2.01,-2.01 2.01,2.01

## QFN-24_MPU6000 [mm]
pads (24):
  rect 0.9x0.27 smd: 1(-2.05,1.25) 2(-2.05,0.75) 3(-2.05,0.25) 4(-2.05,-0.25) 5(-2.05,-0.75) 6(-2.05,-1.25) 13(2.05,-1.25) 14(2.05,-0.75) 15(2.05,-0.25) 16(2.05,0.25) 17(2.05,0.75) 18(2.05,1.25)
  rect 0.27x0.9 smd paste+0: 7(-1.25,-2.05) 8(-0.75,-2.05) 9(-0.25,-2.05) 10(0.25,-2.05) 11(0.75,-2.05) 12(1.25,-2.05)
  rect 0.27x0.9 smd: 19(1.25,2.05) 20(0.75,2.05) 21(0.25,2.05) 22(-0.25,2.05) 23(-0.75,2.05) 24(-1.25,2.05)
Top Overlay:
  lines w0.127: -2.01,-1.6 -2.01,-2.01 -1.6,-2.01 ; -2.01,1.6 -2.01,2.01 -1.6,2.01 ; 1.6,-2.01 2.01,-2.01 2.01,-1.6 ; 1.6,2.01 2.01,2.01 2.01,1.6
  text "*" at -2.7,1.6 h0.76
3D body: height 0.94, standoff 0.02, extent -2.01,-2.01 2.01,2.01